# Altium schematic symbol library 13-Logicold 逻辑 IC.SchLib: 297 symbols (part 3 of 30)
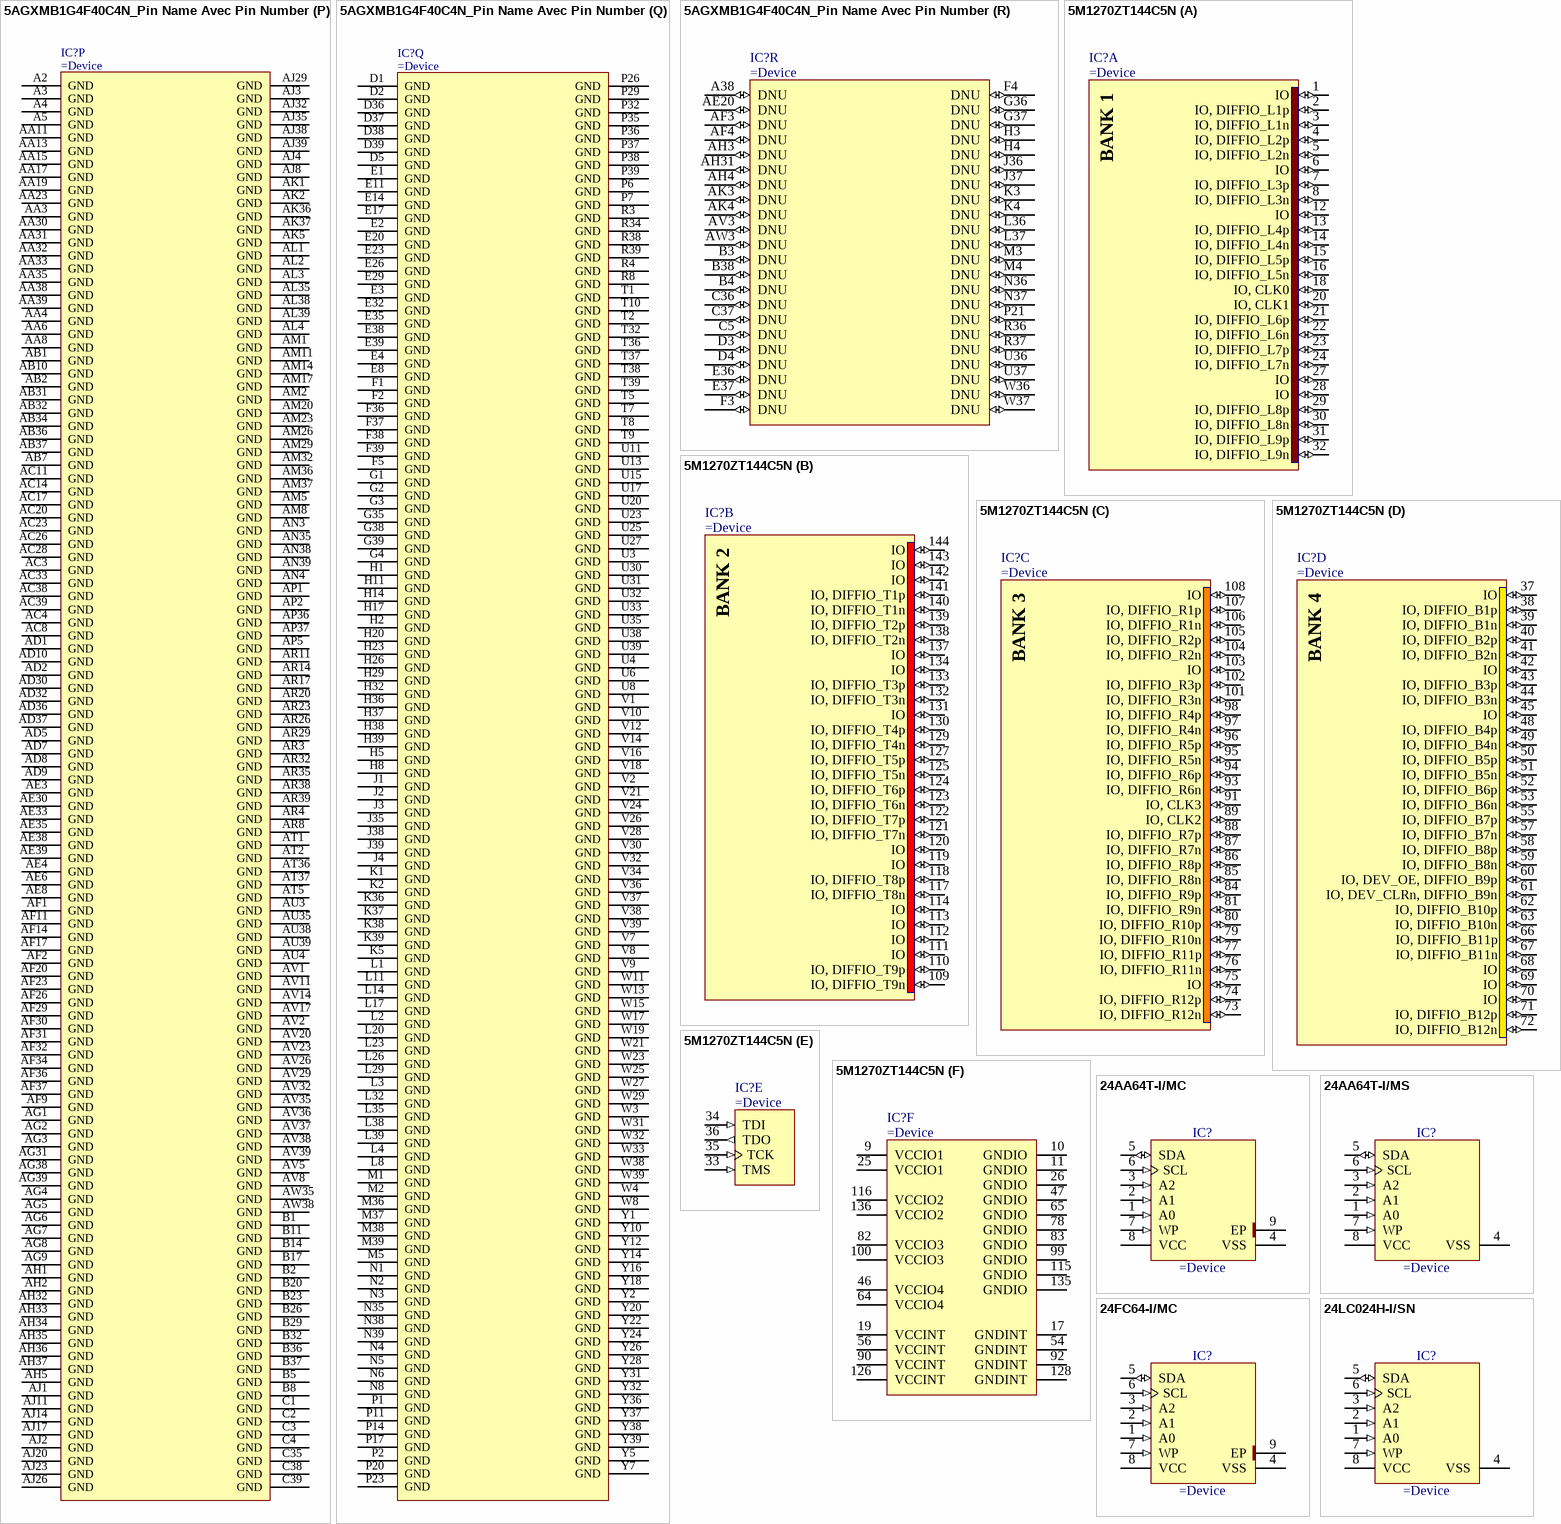
[diagram p165: symbols 5AGXMB1G4F40C4N_Pin Name Avec Pin Number to 24LC024H-I/SN]

## 5AGXMB1G4F40C4N_Pin Name Avec Pin Number
designator IC?
Arria V GX Familly FPGA, 300k Logic Elements, 1517-Pin BGA, Speed Grade 4, Commercial Temperature Grade, Pb-Free
part A pins: AB27 IO_3B_AB27/DIFFIO_RX_B29N/DQ4B (io), AB28 IO_3B_AB28/DIFFIO_RX_B29P/DQ4B (io), AB29 IO_3B_AB29/DIFFIO_TX_B24N (io), AC27 IO_3B_AC27/DIFFIO_RX_B30N/DQ4B (io), AC29 IO_3B_AC29/DIFFIO_TX_B24P/DQ4B (io), AD27 IO_3B_AD27/DIFFIO_RX_B30P/DQ4B (io), AD28 IO_3B_AD28/DIFFIO_TX_B28N (io), AD29 IO_3A_AD29/DIFFIO_TX_B14N (io), AE28 IO_3B_AE28/DIFFIO_TX_B28P/DQ4B (io), AE29 IO_3A_AE29/DIFFIO_TX_B14P/DQ2B (io), AF28 IO_3B_AF28/DIFFIO_RX_B25N/DQ4B (io), AG28 IO_3B_AG28/DIFFIO_RX_B25P/DQ4B (io), AG30 IO_3A_AG30/DIFFIO_RX_B15N/DQ2B (io), AH28 IO_3B_AH28/DIFFIO_RX_B27N/DQSN4B/QK4B (io), AH30 IO_3A_AH30/DIFFIO_RX_B15P/DQ2B (io), AJ27 IO_3B_AJ27/DIFFIO_TX_B33N (io), AJ28 IO_3B_AJ28/DIFFIO_RX_B27P/DQS4B/CQ4B/CQN4B/QKN4B (io), AJ33 IO_3A_AJ33/FPLL_BL_CLKOUT3,FPLL_BL_FBN/DIFFIO_RX_B6N/DQ1B (io), AK27 IO_3B_AK27/DIFFIO_TX_B33P/DQ5B (io), AK29 IO_3B_AK29/DIFFIO_TX_B26N (io), AK30 IO_3A_AK30/DIFFIO_TX_B18N (io), AK31 IO_3A_AK31/DQ1B (io), AK32 IO_3A_AK32/DIFFIO_TX_B3N (io), AK33 IO_3A_AK33/FPLL_BL_CLKOUT2,FPLL_BL_FBP,FPLL_BL_FB1/DIFFIO_RX_B6P/DQ1B (io), AL29 IO_3B_AL29/DIFFIO_TX_B26P/DQ4B (io), AL30 IO_3A_AL30/DIFFIO_TX_B18P/DQ3B (io), AL31 IO_3A_AL31/DIFFIO_TX_B10N (io), AL32 IO_3A_AL32/DIFFIO_TX_B3P/DQ1B (io), AL34 IO_3A_AL34/FPLL_BL_CLKOUT1,FPLL_BL_CLKOUTN/DIFFIO_TX_B5N (io), AM27 IO_3B_AM27/DIFFIO_TX_B37N (io), AM28 IO_3B_AM28/DQ4B (io), AM31 IO_3A_AM31/DIFFIO_TX_B10P/DQ2B (io), AM34 IO_3A_AM34/FPLL_BL_CLKOUT0,FPLL_BL_CLKOUTP,FPLL_BL_FB0/DIFFIO_TX_B5P/DQ1B (io), AN27 IO_3B_AN27/DIFFIO_TX_B37P/DQ5B (io), AN29 IO_3A_AN29/DIFFIO_RX_B23N/DQ3B (io), AN30 IO_3A_AN30/DIFFIO_TX_B22N (io), AN31 IO_3A_AN31/DIFFIO_TX_B12N (io), AN32 IO_3A_AN32/DIFFIO_TX_B8N (io), AN33 IO_3A_AN33_RZQ_0/DIFFIO_TX_B1N (io), AP27 IO_3B_AP27/DIFFIO_TX_B35N (io), AP28 IO_3B_AP28/DIFFIO_TX_B31N (io), AP29 IO_3A_AP29/DIFFIO_RX_B23P/DQ3B (io), AP30 IO_3A_AP30/DIFFIO_TX_B22P/DQ3B (io), AP31 IO_3A_AP31/DIFFIO_TX_B12P/DQ2B (io), AP32 IO_3A_AP32/DIFFIO_TX_B8P/DQ2B (io), AP33 IO_3A_AP33/DIFFIO_TX_B1P/DQ1B (io), AR27 IO_3B_AR27/DIFFIO_TX_B35P/DQ5B (io), AR28 IO_3B_AR28/DIFFIO_TX_B31P/DQ5B (io), AR30 IO_3A_AR30/DIFFIO_RX_B19N/DQSN3B/QK3B (io), AR31 IO_3A_AR31/DIFFIO_RX_B13N/DQ2B (io), AT27 IO_3B_AT27/DIFFIO_RX_B36N/DQ5B (io), AT29 IO_3A_AT29/DIFFIO_RX_B21N/DQ3B (io), AT30 IO_3A_AT30/DIFFIO_RX_B19P/DQS3B/CQ3B/CQN3B/QKN3B (io), AT31 IO_3A_AT31/DIFFIO_RX_B13P/DQ2B (io), AU27 IO_3B_AU27/DIFFIO_RX_B36P/DQ5B (io), AU28 IO_3B_AU28/DIFFIO_RX_B32N/DQ5B (io), AU29 IO_3A_AU29/DIFFIO_RX_B21P/DQ3B (io), AU30 IO_3A_AU30/DIFFIO_TX_B20N (io), AU31 IO_3A_AU31/DIFFIO_TX_B16N (io), AV27 IO_3B_AV27/DIFFIO_RX_B38N/DQ5B (io), AV28 IO_3B_AV28/DIFFIO_RX_B32P/DQ5B (io), AV30 IO_3A_AV30/DIFFIO_TX_B20P/DQ3B (io), AV31 IO_3A_AV31/DIFFIO_TX_B16P/DQ3B (io), AW27 IO_3B_AW27/DIFFIO_RX_B38P/DQ5B (io), AW28 IO_3B_AW28/DIFFIO_RX_B34P/DQS5B/CQ5B/CQN5B/QKN5B (io), AW29 IO_3B_AW29/DIFFIO_RX_B34N/DQSN5B/QK5B (io), AW30 IO_3A_AW30/DIFFIO_RX_B17N/DQ3B (io), AW31 IO_3A_AW31/DIFFIO_RX_B17P/DQ3B (io), AW32 IO_3A_AW32/DIFFIO_RX_B11P/DQS2B/CQ2B/CQN2B/QKN2B (io), AW33 IO_3A_AW33/DIFFIO_RX_B11N/DQSN2B/QK2B (io)
part B pins: AB25 IO_3C_AB25/DIFFIO_RX_B40N/DQ6B (io), AC22 IO_3D_AC22/FPLL_BC_CLKOUT0,FPLL_BC_CLKOUTP,FPLL_BC_FB0/DIFFIO_TX_B79P/DQ11B (io), AC24 IO_3C_AC24/DIFFIO_TX_B43N (io), AC25 IO_3C_AC25/DIFFIO_RX_B40P/DQ6B (io), AD21 IO_3D_AD21/FPLL_BC_CLKOUT1,FPLL_BC_CLKOUTN/DIFFIO_TX_B79N (io), AD22 IO_3D_AD22/DIFFIO_RX_B63N/DQ9B (io), AD23 IO_3C_AD23/DIFFIO_TX_B54N (io), AD24 IO_3C_AD24/DIFFIO_TX_B54P/DQ8B (io), AD25 IO_3C_AD25/DIFFIO_TX_B43P/DQ6B (io), AD26 IO_3C_AD26/DIFFIO_TX_B45N (io), AE22 IO_3D_AE22/DIFFIO_RX_B69N/DQ9B (io), AE23 IO_3D_AE23/DIFFIO_RX_B63P/DQ9B (io), AE24 IO_3C_AE24/DIFFIO_RX_B57N/DQSN8B/QK8B (io), AE25 IO_3C_AE25/DIFFIO_RX_B42N/DQSN6B/QK6B (io), AE26 IO_3C_AE26/DIFFIO_TX_B45P/DQ6B (io), AE27 IO_3C_AE27/DIFFIO_TX_B41N (io), AF22 IO_3D_AF22/DIFFIO_RX_B69P/DQ9B (io), AF24 IO_3C_AF24/DIFFIO_RX_B57P/DQS8B/CQ8B/CQN8B/QKN8B (io), AF25 IO_3C_AF25/DIFFIO_RX_B42P/DQS6B/CQ6B/CQN6B/QKN6B (io), AF27 IO_3C_AF27/DIFFIO_TX_B41P/DQ6B (io), AG20 IO_3D_AG20/DIFFIO_TX_B83N (io), AG21 IO_3D_AG21/FPLL_BC_CLKOUT3,FPLL_BC_FBN/DIFFIO_RX_B80N/DQSN11B/QK11B (io), AG22 IO_3D_AG22/DIFFIO_TX_B74N (io), AG23 IO_3D_AG23/DIFFIO_TX_B68N (io), AG24 IO_3C_AG24/DIFFIO_TX_B58N (io), AG25 IO_3C_AG25/DIFFIO_RX_B46N/DQ6B (io), AG26 IO_3C_AG26/DIFFIO_RX_B44N/DQ6B (io), AG27 IO_3C_AG27/DIFFIO_TX_B39N (io), AH20 IO_3D_AH20/DIFFIO_TX_B83P/DQ11B (io), AH21 IO_3D_AH21/FPLL_BC_CLKOUT2,FPLL_BC_FBP,FPLL_BC_FB1/DIFFIO_RX_B80P/DQS11B/CQ11B/CQN11B/QKN11B (io), AH22 IO_3D_AH22/DIFFIO_TX_B74P/DQ10B (io), AH23 IO_3D_AH23/DIFFIO_TX_B68P/DQ9B (io), AH24 IO_3C_AH24/DIFFIO_TX_B58P/DQ8B (io), AH25 IO_3C_AH25/DIFFIO_RX_B46P/DQ6B (io), AH26 IO_3C_AH26/DIFFIO_RX_B44P/DQ6B (io), AH27 IO_3C_AH27/DIFFIO_TX_B39P/DQ6B (io), AJ25 IO_3C_AJ25/DIFFIO_TX_B49N (io), AK21 IO_3D_AK21/DQ10B (io), AK22 IO_3D_AK22/DIFFIO_TX_B72N (io), AK23 IO_3D_AK23/DIFFIO_TX_B64N (io), AK24 IO_3C_AK24/DIFFIO_TX_B56N (io), AK25 IO_3C_AK25/DIFFIO_TX_B49P/DQ7B (io), AL22 IO_3D_AL22/DIFFIO_TX_B72P/DQ10B (io), AL23 IO_3D_AL23/DIFFIO_TX_B64P/DQ9B (io), AL24 IO_3C_AL24/DIFFIO_TX_B56P/DQ8B (io), AL26 IO_3C_AL26/DQ7B (io), AM21 IO_3D_AM21/DIFFIO_TX_B77N (io), AM25 IO_3C_AM25/DIFFIO_RX_B48N/DQ7B (io), AN20 IO_3D_AN20/DIFFIO_TX_B81N (io), AN21 IO_3D_AN21/DIFFIO_TX_B77P/DQ11B (io), AN22 IO_3D_AN22/DIFFIO_TX_B70N (io), AN23 IO_3D_AN23/DIFFIO_TX_B62N (io), AN24 IO_3C_AN24/DIFFIO_TX_B60N (io), AN25 IO_3C_AN25/DIFFIO_RX_B48P/DQ7B (io), AN26 IO_3C_AN26/DIFFIO_TX_B47N (io), AP20 IO_3D_AP20/DIFFIO_TX_B81P/DQ11B (io), AP22 IO_3D_AP22/DIFFIO_TX_B70P/DQ10B (io), AP23 IO_3D_AP23/DIFFIO_TX_B62P/DQ9B (io), AP24 IO_3C_AP24/DIFFIO_TX_B60P/DQ8B (io), AP26 IO_3C_AP26/DIFFIO_TX_B47P/DQ7B (io), AR21 IO_3D_AR21/DIFFIO_RX_B73N/DQSN10B/QK10B (io), AR25 IO_3C_AR25/DIFFIO_TX_B51N (io), AT20 IO_3D_AT20/DIFFIO_RX_B75N/DQ10B (io), AT21 IO_3D_AT21/DIFFIO_RX_B73P/DQS10B/CQ10B/CQN10B/QKN10B (io), AT22 IO_3D_AT22/DIFFIO_RX_B65N/DQSN9B/QK9B (io), AT23 IO_3C_AT23/DIFFIO_RX_B61N/DQ8B (io), AT24 IO_3C_AT24/DIFFIO_RX_B55N/DQ8B (io), AT25 IO_3C_AT25/DIFFIO_TX_B51P/DQ7B (io), AT26 IO_3C_AT26/DIFFIO_RX_B50N/DQSN7B/QK7B (io), AU20 IO_3D_AU20/DIFFIO_RX_B75P/DQ10B (io), AU22 IO_3D_AU22/DIFFIO_RX_B65P/DQS9B/CQ9B/CQN9B/QKN9B (io), AU23 IO_3C_AU23/DIFFIO_RX_B61P/DQ8B (io), AU24 IO_3C_AU24/DIFFIO_RX_B55P/DQ8B (io), AU26 IO_3C_AU26/DIFFIO_RX_B50P/DQS7B/CQ7B/CQN7B/QKN7B (io), AV21 IO_3D_AV21/DIFFIO_RX_B67N/DQ9B (io), AV22 IO_3D_AV22/DIFFIO_TX_B66N (io), AV24 IO_3C_AV24/DIFFIO_RX_B53P/DQ7B (io), AV25 IO_3C_AV25/DIFFIO_RX_B53N/DQ7B (io), AW19 IO_3D_AW19/DIFFIO_RX_B71N/DQ10B (io), AW20 IO_3D_AW20/DIFFIO_RX_B71P/DQ10B (io), AW21 IO_3D_AW21/DIFFIO_RX_B67P/DQ9B (io), AW22 IO_3D_AW22/DIFFIO_TX_B66P/DQ9B (io), AW23 IO_3C_AW23/DIFFIO_RX_B59N/DQ8B (io), AW24 IO_3C_AW24/DIFFIO_RX_B59P/DQ8B (io), AW25 IO_3C_AW25/DIFFIO_RX_B52N/DQ7B (io), AW26 IO_3C_AW26/DIFFIO_RX_B52P/DQ7B (io)
part C pins: AC12 IO_4B_AC12/DIFFIO_TX_B138N (io), AC13 IO_4B_AC13/DIFFIO_RX_B136N/DQ18B (io), AD11 IO_4B_AD11/DIFFIO_TX_B138P/DQ19B (io), AD12 IO_4B_AD12/DIFFIO_TX_B142N (io), AD13 IO_4B_AD13/DIFFIO_RX_B136P/DQ18B (io), AE12 IO_4B_AE12/DIFFIO_TX_B142P/DQ19B (io), AE13 IO_4B_AE13/DIFFIO_RX_B124P/DQ17B (io), AE14 IO_4B_AE14/DIFFIO_RX_B124N/DQ17B (io), AF12 IO_4B_AF12/DIFFIO_RX_B139N/DQ19B (io), AF13 IO_4B_AF13/DIFFIO_RX_B132N/DQ18B (io), AG11 IO_4B_AG11/DIFFIO_RX_B141N/DQSN19B/QK19B (io), AG12 IO_4B_AG12/DIFFIO_RX_B139P/DQ19B (io), AG13 IO_4B_AG13/DIFFIO_RX_B132P/DQ18B (io), AH8 IO_4A_AH8/DQ21B (io), AH11 IO_4B_AH11/DIFFIO_RX_B141P/DQS19B/CQ19B/CQN19B/QKN19B (io), AH12 IO_4B_AH12/DIFFIO_TX_B131N (io), AH13 IO_4B_AH13/DIFFIO_RX_B130N/DQ17B (io), AJ12 IO_4B_AJ12/DIFFIO_TX_B131P/DQ18B (io), AJ13 IO_4B_AJ13/DIFFIO_RX_B130P/DQ17B (io), AK8 IO_4A_AK8/DIFFIO_TX_B165N (io), AK9 IO_4A_AK9/DIFFIO_TX_B150N (io), AK10 IO_4A_AK10/DIFFIO_TX_B150P/DQ20B (io), AK11 IO_4B_AK11/DIFFIO_TX_B144N (io), AK12 IO_4B_AK12/DIFFIO_TX_B135N (io), AL7 IO_4A_AL7/FPLL_BR_CLKOUT1,FPLL_BR_CLKOUTN/DIFFIO_TX_B161N (io), AL8 IO_4A_AL8/DIFFIO_TX_B165P/DQ22B (io), AL9 IO_4A_AL9/DIFFIO_TX_B146N (io), AL10 IO_4B_AL10/DIFFIO_RX_B145N/DQ19B (io), AL11 IO_4B_AL11/DIFFIO_TX_B144P/DQ19B (io), AL12 IO_4B_AL12/DIFFIO_TX_B135P/DQ18B (io), AL13 IO_4B_AL13/DIFFIO_TX_B127N (io), AM7 IO_4A_AM7/FPLL_BR_CLKOUT0,FPLL_BR_CLKOUTP,FPLL_BR_FB0/DIFFIO_TX_B161P/DQ22B (io), AM9 IO_4A_AM9/DIFFIO_TX_B146P/DQ20B (io), AM10 IO_4B_AM10/DIFFIO_RX_B145P/DQ19B (io), AM13 IO_4B_AM13/DIFFIO_TX_B127P/DQ17B (io), AN7 IO_4A_AN7/DIFFIO_TX_B167N (io), AN8 IO_4A_AN8/FPLL_BR_CLKOUT3,FPLL_BR_FBN/DIFFIO_RX_B162N/DQ22B (io), AN9 IO_4A_AN9/DIFFIO_TX_B152N (io), AN12 IO_4B_AN12/DIFFIO_TX_B129N (io), AP7 RZQ_1_AP7/DIFFIO_TX_B167P/DQ22B (io), AP8 IO_4A_AP8/FPLL_BR_CLKOUT2,FPLL_BR_FBP,FPLL_BR_FB1/DIFFIO_RX_B162P/DQ22B (io), AP9 IO_4A_AP9/DIFFIO_TX_B152P/DQ20B (io), AP10 IO_4B_AP10/DIFFIO_RX_B143N/DQ19B (io), AP11 IO_4B_AP11/DQ18B (io), AP12 IO_4B_AP12/DIFFIO_TX_B129P/DQ17B (io), AP13 IO_4B_AP13/DIFFIO_TX_B123N (io), AR9 IO_4A_AR9/DIFFIO_RX_B153P/DQ20B (io), AR10 IO_4B_AR10/DIFFIO_RX_B143P/DQ19B (io), AR13 IO_4B_AR13/DIFFIO_TX_B123P/DQ17B (io), AT6 IO_4A_AT6/DIFFIO_TX_B163N (io), AT8 IO_4A_AT8/DIFFIO_RX_B153N/DQ20B (io), AT9 IO_4B_AT9/DIFFIO_TX_B140N (io), AT11 IO_4B_AT11/DIFFIO_RX_B134N/DQSN18B/QK18B (io), AT12 IO_4B_AT12/DIFFIO_TX_B125N (io), AU6 IO_4A_AU6/DIFFIO_TX_B163P/DQ22B (io), AU7 IO_4A_AU7/DIFFIO_RX_B151N/DQ20B (io), AU8 IO_4A_AU8/DIFFIO_RX_B151P/DQ20B (io), AU9 IO_4B_AU9/DIFFIO_TX_B140P/DQ19B (io), AU10 IO_4B_AU10/DIFFIO_TX_B133N (io), AU11 IO_4B_AU11/DIFFIO_RX_B134P/DQS18B/CQ18B/CQN18B/QKN18B (io), AU12 IO_4B_AU12/DIFFIO_TX_B125P/DQ17B (io), AV6 IO_4A_AV6/DIFFIO_TX_B148P/DQ20B (io), AV7 IO_4A_AV7/DIFFIO_TX_B148N (io), AV9 IO_4B_AV9/DIFFIO_RX_B137N/DQ18B (io), AV10 IO_4B_AV10/DIFFIO_TX_B133P/DQ18B (io), AV12 IO_4B_AV12/DIFFIO_RX_B126N/DQSN17B/QK17B (io), AW5 IO_4A_AW5/DIFFIO_RX_B149P/DQS20B/CQ20B/CQN20B/QKN20B (io), AW6 IO_4A_AW6/DIFFIO_RX_B149N/DQSN20B/QK20B (io), AW7 IO_4A_AW7/DIFFIO_RX_B147N/DQ20B (io), AW8 IO_4A_AW8/DIFFIO_RX_B147P/DQ20B (io), AW9 IO_4B_AW9/DIFFIO_RX_B137P/DQ18B (io), AW10 IO_4B_AW10/DIFFIO_RX_B128N/DQ17B (io), AW11 IO_4B_AW11/DIFFIO_RX_B128P/DQ17B (io), AW12 IO_4B_AW12/DIFFIO_RX_B126P/DQS17B/CQ17B/CQN17B/QKN17B (io)
part D pins: AC15 IO_4C_AC15/DIFFIO_TX_B115N (io), AC16 IO_4C_AC16/DIFFIO_TX_B110N (io), AC18 IO_4D_AC18/DIFFIO_TX_B97P/DQ13B (io), AC19 IO_4D_AC19/DIFFIO_TX_B95N (io), AD14 IO_4C_AD14/DIFFIO_TX_B115P/DQ16B (io), AD15 IO_4C_AD15/DIFFIO_RX_B122N/DQ16B (io), AD16 IO_4C_AD16/DIFFIO_TX_B110P/DQ15B (io), AD17 IO_4D_AD17/DIFFIO_TX_B97N (io), AD18 IO_4D_AD18/DIFFIO_RX_B98N/DQ13B (io), AD19 IO_4D_AD19/DIFFIO_TX_B95P/DQ13B (io), AE15 IO_4C_AE15/DIFFIO_RX_B122P/DQ16B (io), AE16 IO_4C_AE16/DIFFIO_RX_B118N/DQSN16B/QK16B (io), AE17 IO_4D_AE17/DIFFIO_RX_B107N/DQ14B (io), AE18 IO_4D_AE18/DIFFIO_RX_B98P/DQ13B (io), AE19 IO_4D_AE19/DIFFIO_TX_B91N (io), AF15 IO_4C_AF15/DIFFIO_RX_B118P/DQS16B/CQ16B/CQN16B/QKN16B (io), AF16 IO_4D_AF16/DIFFIO_RX_B107P/DQ14B (io), AF19 IO_4D_AF19/DIFFIO_TX_B91P/DQ12B (io), AG14 IO_4C_AG14/DIFFIO_TX_B121N (io), AG16 IO_4C_AG16/DIFFIO_RX_B111N/DQSN15B/QK15B (io), AG17 IO_4D_AG17/DIFFIO_TX_B100N (io), AG18 IO_4D_AG18/DQ13B (io), AG19 IO_4D_AG19/DIFFIO_RX_B86N/DQ12B (io), AH14 IO_4C_AH14/DIFFIO_TX_B121P/DQ16B (io), AH15 IO_4C_AH15/DQ15B (io), AH16 IO_4C_AH16/DIFFIO_RX_B111P/DQS15B/CQ15B/CQN15B/QKN15B (io), AH17 IO_4D_AH17/DIFFIO_TX_B100P/DQ14B (io), AH18 IO_4D_AH18/DIFFIO_TX_B89N (io), AH19 IO_4D_AH19/DIFFIO_RX_B86P/DQ12B (io), AJ16 IO_4D_AJ16/DIFFIO_TX_B104N (io), AJ18 IO_4D_AJ18/DIFFIO_TX_B89P/DQ12B (io), AK14 IO_4C_AK14/DIFFIO_TX_B119N (io), AK15 IO_4C_AK15/DIFFIO_TX_B112N (io), AK16 IO_4D_AK16/DIFFIO_TX_B104P/DQ14B (io), AK17 IO_4D_AK17/DIFFIO_TX_B93N (io), AK19 IO_4D_AK19/DIFFIO_RX_B88N/DQSN12B/QK12B (io), AL14 IO_4C_AL14/DIFFIO_TX_B119P/DQ16B (io), AL15 IO_4C_AL15/DIFFIO_TX_B112P/DQ15B (io), AL16 IO_4D_AL16/DIFFIO_TX_B106N (io), AL17 IO_4D_AL17/DIFFIO_TX_B93P/DQ13B (io), AL18 IO_4D_AL18/DIFFIO_RX_B99N/DQ13B (io), AL19 IO_4D_AL19/DIFFIO_RX_B88P/DQS12B/CQ12B/CQN12B/QKN12B (io), AM16 IO_4D_AM16/DIFFIO_TX_B106P/DQ14B (io), AM18 IO_4D_AM18/DIFFIO_RX_B99P/DQ13B (io), AN14 IO_4C_AN14/DIFFIO_RX_B120N/DQ16B (io), AN15 IO_4C_AN15/DIFFIO_TX_B108N (io), AN16 IO_4D_AN16/DIFFIO_RX_B105N/DQ14B (io), AN17 IO_4D_AN17/DIFFIO_RX_B101N/DQ14B (io), AN19 IO_4D_AN19/DIFFIO_TX_B87N (io), AP14 IO_4C_AP14/DIFFIO_RX_B120P/DQ16B (io), AP15 IO_4C_AP15/DIFFIO_TX_B108P/DQ15B (io), AP16 IO_4D_AP16/DIFFIO_RX_B105P/DQ14B (io), AP17 IO_4D_AP17/DIFFIO_RX_B101P/DQ14B (io), AP18 IO_4D_AP18/DIFFIO_RX_B96N/DQSN13B/QK13B (io), AP19 IO_4D_AP19/DIFFIO_TX_B87P/DQ12B (io), AR16 IO_4D_AR16/DIFFIO_TX_B102N (io), AR18 IO_4D_AR18/DIFFIO_RX_B96P/DQS13B/CQ13B/CQN13B/QKN13B (io), AT13 IO_4C_AT13/DIFFIO_TX_B117N (io), AT14 IO_4C_AT14/DIFFIO_RX_B116N/DQ16B (io), AT15 IO_4C_AT15/DIFFIO_RX_B114N/DQ15B (io), AT16 IO_4D_AT16/DIFFIO_TX_B102P/DQ14B (io), AT17 IO_4D_AT17/DIFFIO_RX_B94N/DQ13B (io), AT19 IO_4D_AT19/DIFFIO_RX_B90P/DQ12B (io), AU13 IO_4C_AU13/DIFFIO_TX_B117P/DQ16B (io), AU14 IO_4C_AU14/DIFFIO_RX_B116P/DQ16B (io), AU15 IO_4C_AU15/DIFFIO_RX_B114P/DQ15B (io), AU16 IO_4D_AU16/DIFFIO_RX_B103N/DQSN14B/QK14B (io), AU17 IO_4D_AU17/DIFFIO_RX_B94P/DQ13B (io), AU18 IO_4D_AU18/DIFFIO_RX_B90N/DQ12B (io), AV13 IO_4C_AV13/DIFFIO_RX_B113N/DQ15B (io), AV16 IO_4D_AV16/DIFFIO_RX_B103P/DQS14B/CQ14B/CQN14B/QKN14B (io), AV18 IO_4D_AV18/DIFFIO_TX_B85N (io), AW13 IO_4C_AW13/DIFFIO_RX_B113P/DQ15B (io), AW14 IO_4C_AW14/DIFFIO_RX_B109N/DQ15B (io), AW15 IO_4C_AW15/DIFFIO_RX_B109P/DQ15B (io), AW16 IO_4D_AW16/DIFFIO_RX_B92P/DQ12B (io), AW17 IO_4D_AW17/DIFFIO_RX_B92N/DQ12B (io), AW18 IO_4D_AW18/DIFFIO_TX_B85P/DQ12B (io)
part E pins: A7 IO_7A_A7/DIFFIO_RX_T20P/DQS3T/CQ3T/CQN3T/QKN3T (io), A8 IO_7A_A8/DIFFIO_RX_T22N/DQ3T (io), A9 IO_7A_A9/DIFFIO_RX_T22P/DQ3T (io), A10 IO_7B_A10/DIFFIO_RX_T30N/DQ4T (io), A11 IO_7B_A11/DIFFIO_RX_T30P/DQ4T (io), A12 IO_7B_A12/DIFFIO_RX_T41N/DQ6T (io), A13 IO_7B_A13/DIFFIO_RX_T41P/DQ6T (io), A14 IO_7B_A14/DIFFIO_TX_T44P/DQ6T (io), B7 IO_7A_B7/DIFFIO_RX_T20N/DQSN3T/QK3T (io), B9 IO_7A_B9/DIFFIO_TX_T21P/DQ3T (io), B10 IO_7B_B10/DIFFIO_RX_T26P/DQ4T (io), B12 IO_7B_B12/DIFFIO_RX_T39P/DQ6T (io), B13 IO_7B_B13/DIFFIO_TX_T44N (io), C7 IO_7A_C7/DIFFIO_TX_T6P/DQ1T (io), C8 IO_7A_C8/DIFFIO_RX_T18P/DQ3T (io), C9 IO_7A_C9/DIFFIO_TX_T21N (io), C10 IO_7B_C10/DIFFIO_RX_T26N/DQ4T (io), C11 IO_7B_C11/DIFFIO_RX_T33P/DQ5T (io), C12 IO_7B_C12/DIFFIO_RX_T39N/DQ6T (io), C14 IO_7B_C14/DIFFIO_RX_T45P/DQ6T (io), D7 IO_7A_D7/DIFFIO_TX_T6N (io), D8 IO_7A_D8/DIFFIO_RX_T18N/DQ3T (io), D9 IO_7A_D9/DIFFIO_RX_T16P/DQ3T (io), D11 IO_7B_D11/DIFFIO_RX_T33N/DQ5T (io), D12 IO_7B_D12/DIFFIO_RX_T35P/DQS5T/CQ5T/CQN5T/QKN5T (io), D13 IO_7B_D13/DIFFIO_RX_T43P/DQS6T/CQ6T/CQN6T/QKN6T (io), D14 IO_7B_D14/DIFFIO_RX_T45N/DQ6T (io), E9 IO_7A_E9/DIFFIO_RX_T16N/DQ3T (io), E10 IO_7B_E10/DIFFIO_RX_T24P/DQ4T (io), E12 IO_7B_E12/DIFFIO_RX_T35N/DQSN5T/QK5T (io), E13 IO_7B_E13/DIFFIO_RX_T43N/DQSN6T/QK6T (io), F6 IO_7A_RZQ_5/DIFFIO_TX_T2P/DQ1T (io), F7 IO_7A_F7/DIFFIO_TX_T4P/DQ1T (io), F8 IO_7A_F8/FPLL_TR_CLKOUT2,FPLL_TR_FBP,FPLL_TR_FB1/DIFFIO_RX_T7P/DQ1T (io), F9 IO_7A_F9/DIFFIO_TX_T17P/DQ3T (io), F10 IO_7B_F10/DIFFIO_RX_T24N/DQ4T (io), F11 IO_7B_F11/DQ5T (io), F12 IO_7B_F12/DIFFIO_TX_T36P/DQ5T (io), G6 IO_7A_G6/DIFFIO_TX_T2N (io), G7 IO_7A_G7/DIFFIO_TX_T4N (io), G8 IO_7A_G8/FPLL_TR_CLKOUT3,FPLL_TR_FBN/DIFFIO_RX_T7N/DQ1T (io), G9 IO_7A_G9/DIFFIO_TX_T17N (io), G12 IO_7B_G12/DIFFIO_TX_T36N (io), G13 IO_7B_G13/DIFFIO_TX_T46P/DQ6T (io), H9 IO_7A_H9/DIFFIO_TX_T23P/DQ3T (io), H10 IO_7B_H10/DIFFIO_TX_T27P/DQ4T (io), H12 IO_7B_H12/DIFFIO_TX_T38P/DQ5T (io), H13 IO_7B_H13/DIFFIO_TX_T46N (io), J8 IO_7A_J8/FPLL_TR_CLKOUT0,FPLL_TR_CLKOUTP,FPLL_TR_FB0/DIFFIO_TX_T8P/DQ1T (io), J9 IO_7A_J9/DIFFIO_TX_T23N (io), J10 IO_7B_J10/DIFFIO_TX_T27N (io), J11 IO_7B_J11/DIFFIO_TX_T31P/DQ4T (io), J12 IO_7B_J12/DIFFIO_TX_T38N (io), J13 IO_7B_J13/DIFFIO_TX_T42P/DQ6T (io), K7 IO_7A_K7/DQ2T (io), K8 IO_7A_K8/FPLL_TR_CLKOUT1,FPLL_TR_CLKOUTN/DIFFIO_TX_T8N (io), K9 IO_7A_K9/DIFFIO_TX_T19P/DQ3T (io), K11 IO_7B_K11/DIFFIO_TX_T31N (io), K12 IO_7B_K12/DIFFIO_TX_T34P/DQ5T (io), K13 IO_7B_K13/DIFFIO_TX_T42N (io), L9 IO_7A_L9/DIFFIO_TX_T19N (io), L12 IO_7B_L12/DIFFIO_TX_T34N (io), M8 IO_7A_M8/DIFFIO_TX_T11P/DQ2T (io), M11 IO_7B_M11/DIFFIO_TX_T25N (io), M12 IO_7B_M12/DIFFIO_RX_T32P/DQ5T (io), M13 IO_7B_M13/DIFFIO_TX_T40P/DQ6T (io), N10 IO_7B_N10/DIFFIO_TX_T25P/DQ4T (io), N12 IO_7B_N12/DIFFIO_RX_T32N/DQ5T (io), N13 IO_7B_N13/DIFFIO_TX_T40N (io), P12 IO_7B_P12/DIFFIO_RX_T28P/DQS4T/CQ4T/CQN4T/QKN4T (io), P13 IO_7B_P13/DIFFIO_RX_T37P/DQ5T (io), R11 IO_7B_R11/DIFFIO_TX_T29P/DQ4T (io), R12 IO_7B_R12/DIFFIO_RX_T28N/DQSN4T/QK4T (io), R13 IO_7B_R13/DIFFIO_RX_T37N/DQ5T (io), T11 IO_7B_T11/DIFFIO_TX_T29N (io)
part F pins: A15 IO_7C_A15/DIFFIO_TX_T59P/DQ8T (io), A16 IO_7D_A16/DIFFIO_RX_T75N/DQ10T (io), A17 IO_7D_A17/DIFFIO_RX_T75P/DQ10T (io), A18 IO_7D_A18/DIFFIO_RX_T81P/DQS11T/CQ11T/CQN11T/QKN11T (io), A19 IO_7D_A19/DIFFIO_RX_T81N/DQSN11T/QK11T (io), B15 IO_7C_B15/DIFFIO_TX_T59N (io), B16 IO_7D_B16/DIFFIO_RX_T64P/DQ9T (io), B18 IO_7D_B18/DIFFIO_TX_T74P/DQ10T (io), C15 IO_7C_C15/DQ8T (io), C16 IO_7D_C16/DIFFIO_RX_T64N/DQ9T (io), C17 IO_7D_C17/DIFFIO_RX_T68P/DQ9T (io), C18 IO_7D_C18/DIFFIO_TX_T74N (io), C19 IO_7D_C19/DIFFIO_RX_T79P/DQ11T (io), D16 IO_7C_D16/DIFFIO_RX_T60P/DQ8T (io), D17 IO_7D_D17/DIFFIO_RX_T68N/DQ9T (io), D19 IO_7D_D19/DIFFIO_RX_T79N/DQ11T (io), E15 IO_7C_E15/DIFFIO_RX_T53P/DQ7T (io), E16 IO_7C_E16/DIFFIO_RX_T60N/DQ8T (io), E18 IO_7D_E18/DIFFIO_RX_T71P/DQ10T (io), F14 IO_7C_F14/DIFFIO_RX_T49P/DQ7T (io), F15 IO_7C_F15/DIFFIO_RX_T53N/DQ7T (io), F17 IO_7D_F17/DIFFIO_RX_T66P/DQS9T/CQ9T/CQN9T/QKN9T (io), F18 IO_7D_F18/DIFFIO_RX_T71N/DQ10T (io), F19 IO_7D_F19/DIFFIO_RX_T77P/DQ11T (io), F20 IO_7D_F20/DIFFIO_RX_T83P/DQ11T (io), G14 IO_7C_G14/DIFFIO_RX_T49N/DQ7T (io), G16 IO_7C_G16/DIFFIO_RX_T58P/DQS8T/CQ8T/CQN8T/QKN8T (io), G17 IO_7D_G17/DIFFIO_RX_T66N/DQSN9T/QK9T (io), G19 IO_7D_G19/DIFFIO_RX_T77N/DQ11T (io), G20 IO_7D_G20/DIFFIO_RX_T83N/DQ11T (io), H15 IO_7C_H15/DIFFIO_TX_T57P/DQ8T (io), H16 IO_7C_H16/DIFFIO_RX_T58N/DQSN8T/QK8T (io), H18 IO_7D_H18/DIFFIO_TX_T72P/DQ10T (io), J14 IO_7C_J14/DIFFIO_TX_T54P/DQ7T (io), J15 IO_7C_J15/DIFFIO_TX_T57N (io), J16 IO_7C_J16/DIFFIO_TX_T61P/DQ8T (io), J17 IO_7D_J17/DIFFIO_TX_T65P/DQ9T (io), J18 IO_7D_J18/DIFFIO_TX_T72N (io), J19 IO_7D_J19/DIFFIO_TX_T78P/DQ11T (io), J20 IO_7D_J20/DIFFIO_TX_T80P/DQ11T (io), K14 IO_7C_K14/DIFFIO_TX_T54N (io), K16 IO_7C_K16/DIFFIO_TX_T61N (io), K17 IO_7D_K17/DIFFIO_TX_T65N (io), K18 IO_7D_K18/DIFFIO_TX_T69P/DQ9T (io), K19 IO_7D_K19/DIFFIO_TX_T78N (io), K20 IO_7D_K20/DIFFIO_TX_T80N (io), L15 IO_7C_L15/DIFFIO_TX_T50P/DQ7T (io), L18 IO_7D_L18/DIFFIO_TX_T69N (io), L19 IO_7D_L19/DIFFIO_TX_T76P/DQ10T (io), M14 IO_7C_M14/DIFFIO_TX_T48P/DQ7T (io), M15 IO_7C_M15/DIFFIO_TX_T50N (io), M16 IO_7C_M16/DIFFIO_RX_T56P/DQ8T (io), M17 IO_7D_M17/DIFFIO_TX_T63P/DQ9T (io), M19 IO_7D_M19/DIFFIO_TX_T76N (io), M20 IO_7D_M20/DIFFIO_TX_T84P/DQ11T (io), N14 IO_7C_N14/DIFFIO_TX_T48N (io), N15 IO_7C_N15/DIFFIO_TX_T52P/DQ7T (io), N16 IO_7C_N16/DIFFIO_RX_T56N/DQ8T (io), N17 IO_7D_N17/DIFFIO_TX_T63N (io), N18 IO_7D_N18/DIFFIO_RX_T62P/DQ9T (io), N19 IO_7D_N19/DIFFIO_RX_T73P/DQS10T/CQ10T/CQN10T/QKN10T (io), N20 IO_7D_N20/DIFFIO_TX_T84N (io), P15 IO_7C_P15/DIFFIO_TX_T52N (io), P16 IO_7C_P16/DIFFIO_RX_T55P/DQ8T (io), P18 IO_7D_P18/DIFFIO_RX_T62N/DQ9T (io), P19 IO_7D_P19/DIFFIO_RX_T73N/DQSN10T/QK10T (io), R14 IO_7C_R14/DIFFIO_RX_T47P/DQ7T (io), R15 IO_7C_R15/DIFFIO_RX_T51P/DQS7T/CQ7T/CQN7T/QKN7T (io), R16 IO_7C_R16/DIFFIO_RX_T55N/DQ8T (io), R17 IO_7D_R17/DIFFIO_TX_T67P/DQ9T (io), R18 IO_7D_R18/DQ10T (io), R19 IO_7D_R19/DIFFIO_RX_T70P/DQ10T (io), R20 IO_7D_R20/DIFFIO_TX_T82P/DQ11T (io), T14 IO_7C_T14/DIFFIO_RX_T47N/DQ7T (io), T15 IO_7C_T15/DIFFIO_RX_T51N/DQSN7T/QK7T (io), T17 IO_7D_T17/DIFFIO_TX_T67N (io), T19 IO_7D_T19/DIFFIO_RX_T70N/DQ10T (io), T20 IO_7D_T20/DIFFIO_TX_T82N (io)
part G pins: A28 IO_8B_A28/DIFFIO_RX_T140N/DQ19T (io), A29 IO_8B_A29/DIFFIO_RX_T140P/DQ19T (io), A30 IO_8A_A30/DIFFIO_RX_T148N/DQ20T (io), A31 IO_8A_A31/DIFFIO_TX_T149P/DQ20T (io), A32 IO_8A_A32/DIFFIO_TX_T149N (io), A33 IO_8A_A33/DIFFIO_RX_T150P/DQS20T/CQ20T/CQN20T/QKN20T (io), A35 IO_8A_A35/FPLL_TL_CLKOUT3,FPLL_TL_FBN/DIFFIO_RX_T163N/DQ22T (io), B28 IO_8B_B28/DIFFIO_RX_T139P/DQ19T (io), B30 IO_8A_B30/DIFFIO_RX_T146P/DQ20T (io), B31 IO_8A_B31/DIFFIO_RX_T148P/DQ20T (io), B33 IO_8A_B33/DIFFIO_RX_T150N/DQSN20T/QK20T (io), B34 IO_8A_B34/FPLL_TL_CLKOUT2,FPLL_TL_FBP,FPLL_TL_FB1/DIFFIO_RX_T163P/DQ22T (io), C28 IO_8B_C28/DIFFIO_RX_T133P/DQ18T (io), C29 IO_8B_C29/DIFFIO_RX_T139N/DQ19T (io), C30 IO_8A_C30/DIFFIO_RX_T146N/DQ20T (io), C31 IO_8A_C31/DIFFIO_RX_T152P/DQ20T (io), C32 IO_8A_C32/DIFFIO_TX_T153P/DQ20T (io), C33 IO_8A_C33/FPLL_TL_CLKOUT0,FPLL_TL_CLKOUTP,FPLL_TL_FB0/DIFFIO_TX_T164P/DQ22T (io), D28 IO_8B_D28/DIFFIO_RX_T133N/DQ18T (io), D29 IO_8B_D29/DIFFIO_RX_T144N/DQ19T (io), D30 IO_8B_D30/DIFFIO_RX_T144P/DQ19T (io), D31 IO_8A_D31/DIFFIO_RX_T152N/DQ20T (io), D32 IO_8A_D32/DIFFIO_TX_T153N (io), D33 IO_8A_D33/FPLL_TL_CLKOUT1,FPLL_TL_CLKOUTN/DIFFIO_TX_T164N (io), E31 IO_8A_E31/DIFFIO_TX_T147P/DQ20T (io), E33 IO_8A_E33/DIFFIO_TX_T168P/DQ22T (io), F28 IO_8B_F28/DIFFIO_TX_T134P/DQ18T (io), F29 IO_8B_F29/DIFFIO_TX_T138P/DQ18T (io), F30 IO_8B_F30/DIFFIO_TX_T145P/DQ19T (io), F31 IO_8A_F31/DIFFIO_TX_T147N (io), F32 IO_8A_F32/DIFFIO_TX_T166P/DQ22T (io), F33 RZQ_6_F33/DIFFIO_TX_T168N (io), G28 IO_8B_G28/DIFFIO_TX_T134N (io), G29 IO_8B_G29/DIFFIO_TX_T138N (io), G30 IO_8B_G30/DIFFIO_TX_T145N (io), G32 IO_8A_G32/DIFFIO_TX_T166N (io), H28 IO_8B_H28/DIFFIO_TX_T132P/DQ18T (io), H31 IO_8A_H31/DIFFIO_TX_T151P/DQ20T (io), J28 IO_8B_J28/DIFFIO_TX_T132N (io), J29 IO_8B_J29/DIFFIO_TX_T136P/DQ18T (io), J30 IO_8B_J30/DIFFIO_TX_T143P/DQ19T (io), J31 IO_8A_J31/DIFFIO_TX_T151N (io), J32 IO_8A_J32/DIFFIO_TX_T155P/DQ21T (io), J33 IO_8A_J33/DQ22T (io), J34 IO_8A_J34/DIFFIO_TX_T157P/DQ21T (io), K29 IO_8B_K29/DIFFIO_TX_T136N (io), K30 IO_8B_K30/DIFFIO_TX_T143N (io), K32 IO_8A_K32/DIFFIO_TX_T155N (io), K34 IO_8A_K34/DIFFIO_TX_T157N (io), L28 IO_8B_L28/DIFFIO_RX_T131P/DQ18T (io), L30 IO_8B_L30/DIFFIO_TX_T141P/DQ19T (io), L31 IO_8A_L31/DIFFIO_TX_T159P/DQ21T (io), L33 IO_8A_L33/DIFFIO_RX_T158P/DQS21T/CQ21T/CQN21T/QKN21T (io), L34 IO_8A_L34/DIFFIO_TX_T161P/DQ21T (io), M28 IO_8B_M28/DIFFIO_RX_T131N/DQ18T (io), M29 IO_8B_M29/DIFFIO_RX_T137P/DQ18T (io), M30 IO_8B_M30/DIFFIO_TX_T141N (io), M31 IO_8A_M31/DIFFIO_TX_T159N (io), M32 IO_8A_M32/DIFFIO_RX_T156P/DQ21T (io), M33 IO_8A_M33/DIFFIO_RX_T158N/DQSN21T/QK21T (io), M34 IO_8A_M34/DIFFIO_TX_T161N (io), N29 IO_8B_N29/DIFFIO_RX_T137N/DQ18T (io), N30 IO_8B_N30/DIFFIO_RX_T142P/DQS19T/CQ19T/CQN19T/QKN19T (io), N31 IO_8A_N31/DIFFIO_RX_T154P/DQ21T (io), N32 IO_8A_N32/DIFFIO_RX_T156N/DQ21T (io), P30 IO_8B_P30/DIFFIO_RX_T142N/DQSN19T/QK19T (io), P31 IO_8A_P31/DIFFIO_RX_T154N/DQ21T (io), R29 IO_8B_R29/DIFFIO_RX_T135P/DQS18T/CQ18T/CQN18T/QKN18T (io), R30 IO_8B_R30/DQ19T (io), T29 IO_8B_T29/DIFFIO_RX_T135N/DQSN18T/QK18T (io)